# Altium footprint library SparkFun.PCBLIB: 674 footprints (part 24 of 44)
Each footprint in its own frame and in the unit in brackets; x right, y up, seen from the top. Pads: shape width x height; smd on the part's side, far side on the other; paste and mask are expansions set on the pad; w line width, h text height; cw(c..) or ccw(c..) is an arc to the next point about the centre after c.
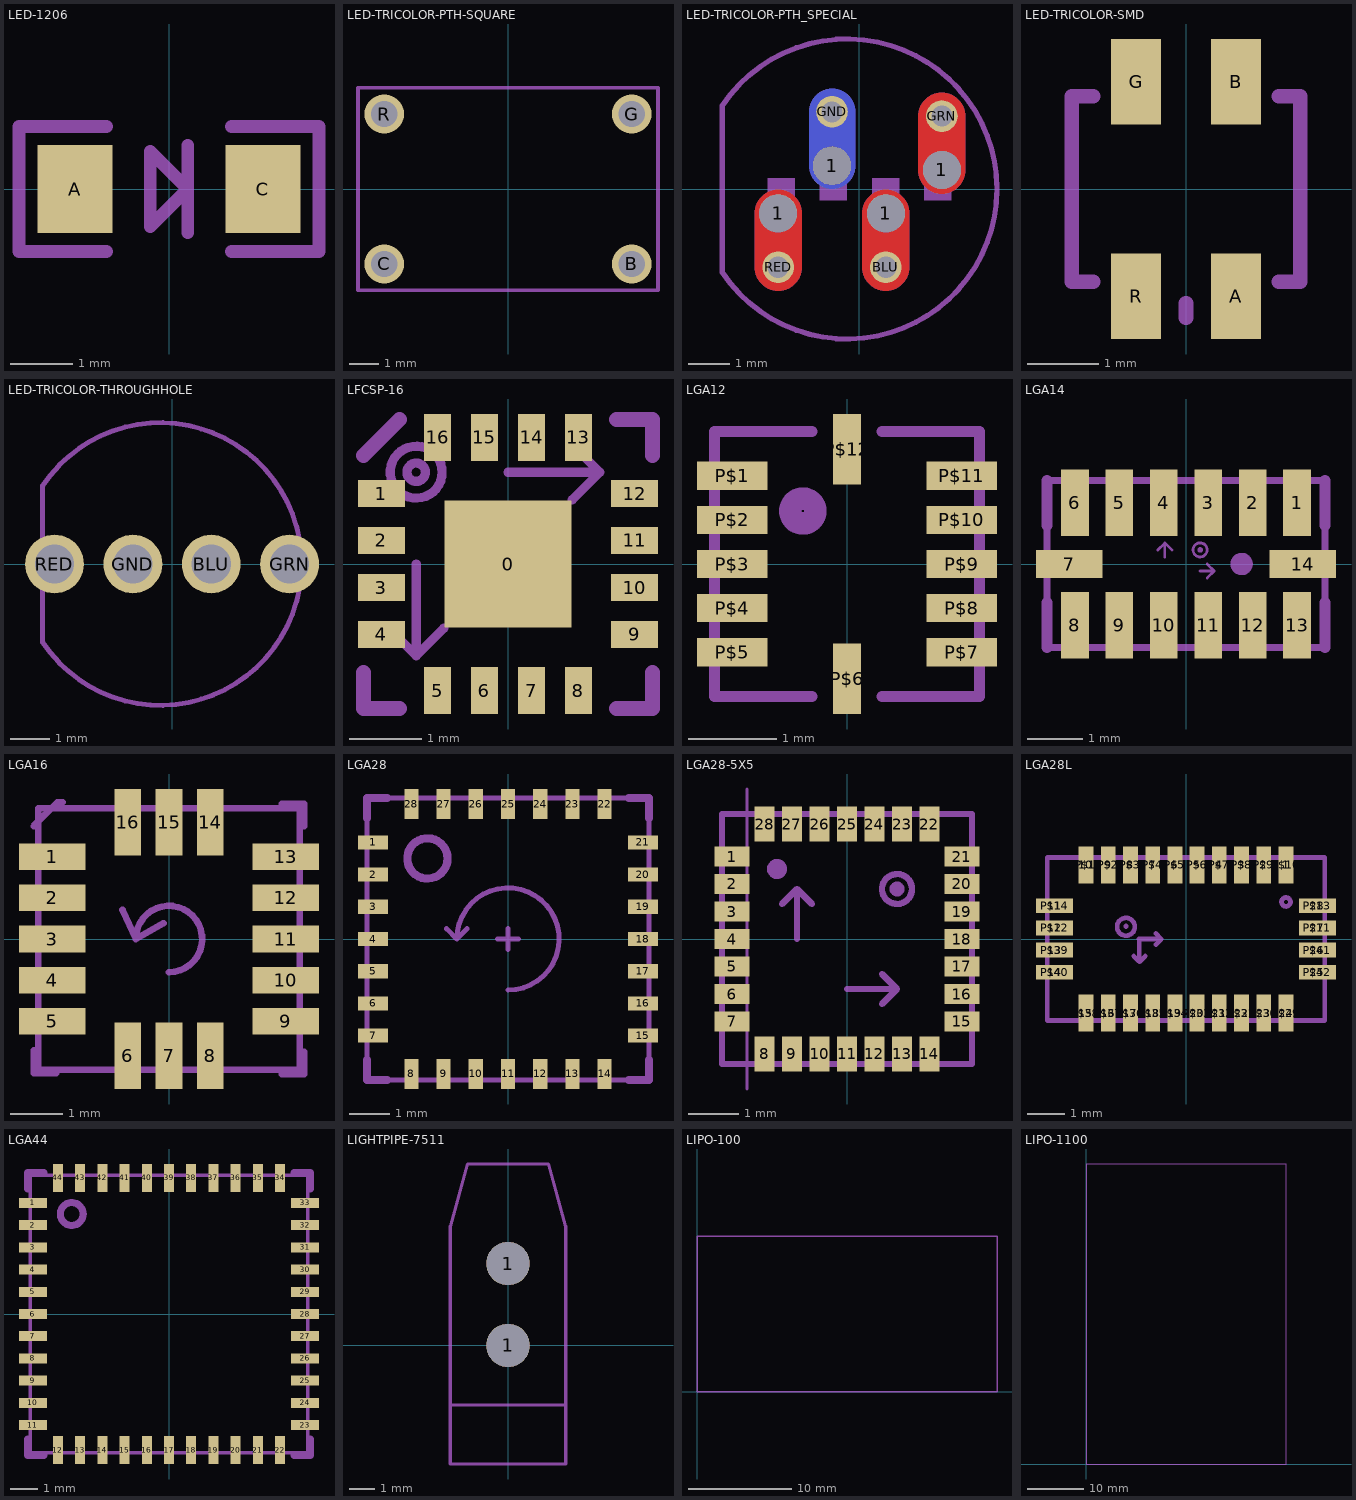
[diagram p23: the footprints below, top view; thin cyan lines are the x and y axes]

## LED-1206 [mil]
pads (2):
  rect 47.24x55.12 smd: A(-59.06,0) C(59.06,0)
Mechanical 2:
  lines w8: -39.37,-39.37 -94.49,-39.37 -94.49,39.37 -39.37,39.37 ; 11.81,-27.56 11.81,0 ; 11.81,27.56 11.81,0 ; 39.37,-39.37 94.49,-39.37 94.49,39.37 39.37,39.37 ; 11.81,0 -11.81,23.62 -11.81,-23.62 11.81,0

## LED-TRICOLOR-PTH-SQUARE [mil]
pads (4):
  round 52.5 hole 35: B(165,-100) C(-165,-100) G(165,100) R(-165,100)
Mechanical 2:
  lines w5: -200,-135 -200,135 200,135 200,-135 -200,-135

## LED-TRICOLOR-PTH_SPECIAL [mil]
pads (8):
  round 36 hole 36: 1(-77,-23) 1(-26,22) 1(25,-23) 1(78,18)
  round 30 hole 20: BLU(25,-74) GND(-26,73) GRN(78,69) RED(-77,-74)
Top Layer:
  lines w45: -77,-74 -77,-23 ; 25,-74 25,-23 ; 78,18 78,69
Bottom Layer:
  lines w44: -26,22 -26,73
  lines w45: -77,-74 -77,-23 ; 25,-74 25,-23 ; 78,18 78,69
Bottom Solder:
  lines w45: -77,-74 -77,-23 ; -26,22 -26,73 ; 25,-74 25,-23 ; 78,18 78,69
Mechanical 2:
  lines w5: -129.92,-78.74 -129.92,78.74 cw(c-11.81,0) -129.92,-78.74
  lines w44: -26,22 -26,73
Mechanical 18:
  rectangle: 11.7,-10.7 37.7,10.3
  rectangle: -37.7,-10.7 -11.7,10.3
  rectangle: -87,-10.7 -61,10.3
  rectangle: 61,-10.7 87,10.3

## LED-TRICOLOR-SMD [mil]
pads (4):
  rect 27.56x47.24 smd: A(27.56,-59.06) B(27.56,59.06) G(-27.56,59.06) R(-27.56,-59.06)
Mechanical 2:
  lines w8: -51.18,-51.18 -62.99,-51.18 -62.99,51.18 -51.18,51.18 ; 0,-70.87 0,-62.99 ; 51.18,-51.18 62.99,-51.18 62.99,51.18 51.18,51.18

## LED-TRICOLOR-THROUGHHOLE [mm]
pads (4):
  round 1.5 hole 1: BLU(1,0) GND(-1,0) GRN(3,0) RED(-3,0)
Mechanical 2:
  lines w0.127: -3.3,-2 -3.3,2 cw(c-0.3,0) -3.3,-2

## LFCSP-16 [mm]
pads (17):
  rect 1.75x1.75 smd paste-0.875: 0(0,0)
  rect 0.65x0.37 smd: 1(-1.75,0.975) 2(-1.75,0.325) 3(-1.75,-0.325) 4(-1.75,-0.975) 9(1.75,-0.975) 10(1.75,-0.325) 11(1.75,0.325) 12(1.75,0.975)
  rect 0.37x0.65 smd: 5(-0.975,-1.75) 6(-0.325,-1.75) 7(0.325,-1.75) 8(0.975,-1.75) 13(0.975,1.75) 14(0.325,1.75) 15(-0.325,1.75) 16(-0.975,1.75)
Top Paste:
  rectangle: -0.25,-0.25 0.25,0.25
Mechanical 2:
  lines w0.203: -2,-1.5 -2,-2 -1.5,-2 ; -2,1.5 -1.5,2 ; 1.5,-2 2,-2 2,-1.5 ; 1.5,2 2,2 2,1.5
Mechanical 18:
  circle w0.127: c-1.27,1.27 r0.359
  circle w0.127: c-1.27,1.27 r0.127
  lines w0.127: -1.651,-0.889 -1.27,-1.27 ; -1.27,0 -1.27,-1.27 ; -0.889,-0.889 -1.27,-1.27 ; 0,1.27 1.27,1.27 ; 0.889,0.889 1.27,1.27 ; 0.889,1.651 1.27,1.27

## LGA12 [mil]
pads (12):
  rect 31.5x12.6 smd: P$1(-51.18,39.37) P$2(-51.18,19.69) P$3(-51.18,0) P$4(-51.18,-19.69) P$5(-51.18,-39.37) P$7(51.18,-39.37) P$8(51.18,-19.69) P$9(51.18,0) P$10(51.18,19.69) P$11(51.18,39.37)
  rect 12.6x31.5 smd: P$6(0,-51.18) P$12(0,51.18)
Mechanical 2:
  circle w10: c-19.69,23.62 r5.57
  lines w5: -59.06,-59.06 -15.75,-59.06 ; -59.06,59.06 -15.75,59.06 ; 15.75,-59.06 59.06,-59.06 ; 15.75,59.06 59.06,59.06
Mechanical 18:
  lines w5: -59.06,-59.06 -59.06,59.06 ; 59.06,-59.06 59.06,59.06

## LGA14 [mm]
pads (14):
  rect 0.5x1.2 smd: 1(2,1.1) 2(1.2,1.1) 3(0.4,1.1) 4(-0.4,1.1) 5(-1.2,1.1) 6(-2,1.1) 8(-2,-1.1) 9(-1.2,-1.1) 10(-0.4,-1.1) 11(0.4,-1.1) 12(1.2,-1.1) 13(2,-1.1)
  rect 1.2x0.5 smd: 7(-2.1,0) 14(2.1,0)
Mechanical 2:
  circle w0.203: c1,0 r0.1
  lines w0.203: -2.5,-1.5 -2.5,-0.7 ; -2.5,0.7 -2.5,1.5 ; 2.5,-1.5 2.5,-0.7 ; 2.5,0.7 2.5,1.5
Mechanical 18:
  circle w0.051: c0.254,0.254 r0.127
  circle w0.051: c0.254,0.254 r0.025
  lines w0.051: -0.508,0.254 -0.381,0.381 ; -0.381,0.127 -0.381,0.381 ; -0.254,0.254 -0.381,0.381 ; 0.254,-0.127 0.508,-0.127 ; 0.381,-0.254 0.508,-0.127 ; 0.381,0 0.508,-0.127
  lines w0.127: -2.5,-1.5 -2.5,1.5 2.5,1.5 2.5,-1.5 -2.5,-1.5

## LGA16 [mil]
pads (16):
  rect 50x20 smd: 1(-88,62) 2(-88,31) 3(-88,0) 4(-88,-31) 5(-88,-62) 9(88,-62) 10(88,-31) 11(88,0) 12(88,31) 13(88,62)
  rect 20x50 smd: 6(-31,-88) 7(0,-88) 8(31,-88) 14(31,88) 15(0,88) 16(-31,88)
Mechanical 2:
  lines w5: -102,-84 -102,-101 -85,-101 ; -102,85 -84,103 -80,103 ; 85,-102 102,-102 102,-85 ; 85,102 102,102 102,85
Mechanical 18:
  lines w5: -35,22 -25,0 ; -4,12 -25,0 ; 0,-25 ccw(c0,0) -25,0 ; -98.5,-98.5 -98.5,98.5 98.5,98.5 98.5,-98.5 -98.5,-98.5

## LGA28 [mm]
pads (28):
  rect 0.75x0.35 smd: 1(-3.35,2.4) 2(-3.35,1.6) 3(-3.35,0.8) 4(-3.35,0) 5(-3.35,-0.8) 6(-3.35,-1.6) 7(-3.35,-2.4) 15(3.35,-2.4) 16(3.35,-1.6) 17(3.35,-0.8) 18(3.35,0) 19(3.35,0.8) 20(3.35,1.6) 21(3.35,2.4)
  rect 0.35x0.75 smd: 8(-2.4,-3.35) 9(-1.6,-3.35) 10(-0.8,-3.35) 11(0,-3.35) 12(0.8,-3.35) 13(1.6,-3.35) 14(2.4,-3.35) 22(2.4,3.35) 23(1.6,3.35) 24(0.8,3.35) 25(0,3.35) 26(-0.8,3.35) 27(-1.6,3.35) 28(-2.4,3.35)
Mechanical 2:
  circle w0.203: c-2,2 r0.5
  lines w0.203: -3.5,-3 -3.5,-3.5 -3,-3.5 ; -3.5,3 -3.5,3.5 -3,3.5 ; 3,-3.5 3.5,-3.5 3.5,-3 ; 3,3.5 3.5,3.5 3.5,3
Mechanical 18:
  lines w0.127: -1.524,0.254 -1.27,0 ; -1.016,0.254 -1.27,0 ; -0.254,0 0.254,0 ; 0,-1.27 ccw(c0,0) -1.27,0 ; 0,-0.254 0,0.254 ; -3.5,-3.5 3.5,-3.5 3.5,3.5 -3.5,3.5 -3.5,-3.5

## LGA28-5X5 [mm]
pads (28):
  rect 0.7x0.4 smd: 1(-2.3,1.65) 2(-2.3,1.1) 3(-2.3,0.55) 4(-2.3,0) 5(-2.3,-0.55) 6(-2.3,-1.1) 7(-2.3,-1.65) 15(2.3,-1.65) 16(2.3,-1.1) 17(2.3,-0.55) 18(2.3,0) 19(2.3,0.55) 20(2.3,1.1) 21(2.3,1.65)
  rect 0.4x0.7 smd: 8(-1.65,-2.3) 9(-1.1,-2.3) 10(-0.55,-2.3) 11(0,-2.3) 12(0.55,-2.3) 13(1.1,-2.3) 14(1.65,-2.3) 22(1.65,2.3) 23(1.1,2.3) 24(0.55,2.3) 25(0,2.3) 26(-0.55,2.3) 27(-1.1,2.3) 28(-1.65,2.3)
Mechanical 2:
  circle w0.2: c-1.4,1.4 r0.1
  lines w0.127: -2.5,-2 -2.5,-2.5 -2,-2.5 ; -2.5,2 -2.5,2.5 -2,2.5 ; 2,-2.5 2.5,-2.5 2.5,-2 ; 2,2.5 2.5,2.5 2.5,2
Mechanical 18:
  circle w0.127: c1,1 r0.3
  circle w0.2: c1,1 r0.05
  lines w0.05: -2,-3 -2,3
  lines w0.127: -1.3,0.7 -1,1 ; -1,0 -1,1 ; -0.7,0.7 -1,1 ; 0,-1 1,-1 ; 0.7,-1.3 1,-1 ; 0.7,-0.7 1,-1 ; -2.5,-2.5 2.5,-2.5 2.5,2.5 -2.5,2.5 -2.5,-2.5

## LGA28L [mm]
pads (56):
  rect 0.4x1 smd: 1(2.7,2) 2(2.1,2) 3(1.5,2) 4(0.9,2) 5(0.3,2) 6(-0.3,2) 7(-0.9,2) 8(-1.5,2) 9(-2.1,2) 10(-2.7,2) 15(-2.7,-2) 16(-2.1,-2) 17(-1.5,-2) 18(-0.9,-2) 19(-0.3,-2) 20(0.3,-2) 21(0.9,-2) 22(1.5,-2) 23(2.1,-2) 24(2.7,-2) P$1(-2.7,2) P$2(-2.1,2) P$3(-1.5,2) P$4(-0.9,2) P$5(-0.3,2) P$6(0.3,2) P$7(0.9,2) P$8(1.5,2) P$9(2.1,2) P$10(2.7,2) P$29(2.7,-2) P$30(2.1,-2) P$31(1.5,-2) P$32(0.9,-2) P$33(0.3,-2) P$34(-0.3,-2) P$35(-0.9,-2) P$36(-1.5,-2) P$37(-2.1,-2) P$38(-2.7,-2)
  rect 1x0.4 smd: 11(-3.55,0.9) 12(-3.55,0.3) 13(-3.55,-0.3) 14(-3.55,-0.9) 25(3.55,-0.9) 26(3.55,-0.3) 27(3.55,0.3) 28(3.55,0.9) P$11(3.55,0.3) P$12(-3.55,0.3) P$13(3.55,0.9) P$14(-3.55,0.9) P$39(-3.55,-0.3) P$40(-3.55,-0.9) P$41(3.55,-0.3) P$42(3.55,-0.9)
Mechanical 2:
  circle w0.127: c2.7,1 r0.12
  lines w0.127: -3.75,-1.27 -3.75,-2.2 -3.07,-2.2 ; -3.75,1.26 -3.75,2.2 -3.07,2.2 ; 3.07,-2.2 3.75,-2.2 3.75,-1.27 ; 3.07,2.2 3.75,2.2 3.75,1.27
Mechanical 18:
  circle w0.127: c-1.62,0.33 r0.24
  lines w0.127: -1.62,0.34 -1.62,0.35 ; -1.41,-0.46 -1.27,-0.6 -1.26,-0.6 -1.26,0 ; -1.27,0 -1.26,0 ; -1.26,-0.61 -1.25,-0.61 -1.1,-0.46 ; -0.82,0.15 -0.67,0 ; -0.81,-0.15 -0.67,-0.01 -0.67,0 ; -1.26,0 -0.67,0 ; -3.75,-2.2 -3.75,2.2 3.75,2.2 3.75,-2.2 -3.75,-2.2

## LGA44 [mm]
pads (44):
  rect 1x0.36 smd: 1(-4.9,4) 2(-4.9,3.2) 3(-4.9,2.4) 4(-4.9,1.6) 5(-4.9,0.8) 6(-4.9,0) 7(-4.9,-0.8) 8(-4.9,-1.6) 9(-4.9,-2.4) 10(-4.9,-3.2) 11(-4.9,-4) 23(4.9,-4) 24(4.9,-3.2) 25(4.9,-2.4) 26(4.9,-1.6) 27(4.9,-0.8) 28(4.9,0) 29(4.9,0.8) 30(4.9,1.6) 31(4.9,2.4) 32(4.9,3.2) 33(4.9,4)
  rect 0.36x1 smd: 12(-4,-4.9) 13(-3.2,-4.9) 14(-2.4,-4.9) 15(-1.6,-4.9) 16(-0.8,-4.9) 17(0,-4.9) 18(0.8,-4.9) 19(1.6,-4.9) 20(2.4,-4.9) 21(3.2,-4.9) 22(4,-4.9) 34(4,4.9) 35(3.2,4.9) 36(2.4,4.9) 37(1.6,4.9) 38(0.8,4.9) 39(0,4.9) 40(-0.8,4.9) 41(-1.6,4.9) 42(-2.4,4.9) 43(-3.2,4.9) 44(-4,4.9)
Mechanical 2:
  circle w0.254: c-3.5,3.6 r0.412
  lines w0.254: -5.1,-4.5 -5.1,-5.1 -4.5,-5.1 ; -5.1,4.5 -5.1,5.1 -4.5,5.1 ; 4.5,-5.1 5.1,-5.1 5.1,-4.5 ; 4.5,5.1 5.1,5.1 5.1,4.5
Mechanical 18:
  lines w0.127: -5,-5 -5,5 5,5 5,-5 -5,-5

## LIGHTPIPE-7511 [mil]
pads (2):
  round 66 hole 66: 1(0,0) 1(0,125)
Mechanical 2:
  lines w5: -88,-91 -88,-181 88,-181 88,-91 ; -88,-91 -88,182 -62,277 62,277 88,182 88,-91 ; -88,-91 88,-91

## LIPO-100 [mil]
Mechanical 18:
  lines w5: 0,0 0,590.55 1141.73,590.55 1141.73,0 0,0

## LIPO-1100 [mil]
Mechanical 18:
  lines w8: 0,0 1400,0 1400,2100 0,2100 0,0